# Altium footprint library connector.PcbLib: 138 footprints (part 3 of 9)
Each footprint in its own frame and in the unit in brackets; x right, y up, seen from the top. Pads: shape width x height; smd on the part's side, far side on the other; paste and mask are expansions set on the pad; w line width, h text height; cw(c..) or ccw(c..) is an arc to the next point about the centre after c.
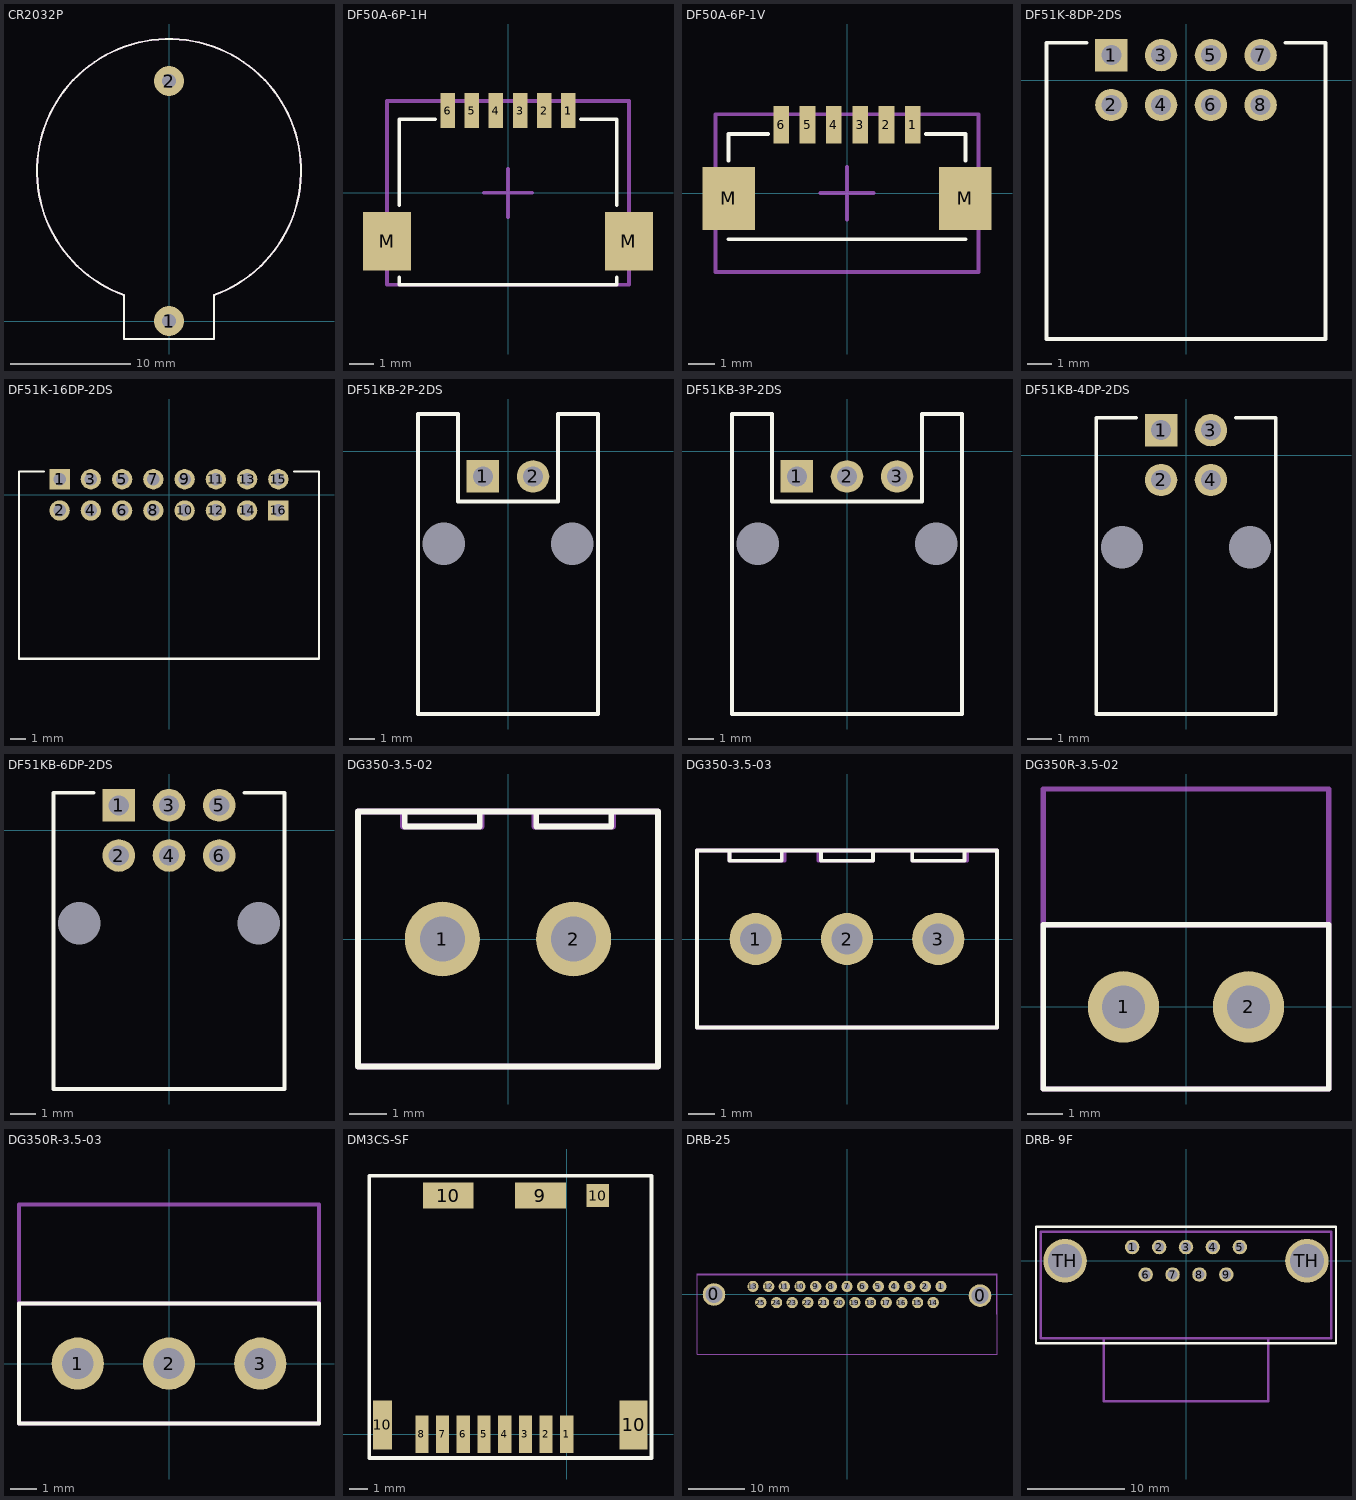
[diagram p2: the footprints below, top view; thin cyan lines are the x and y axes]

## CR2032P [mm] "Top and Side Loading Coin Cell Holders"
pads (2):
  round 2.5 hole 1.2: 1(0,0) 2(0,20)
Top Overlay:
  lines w0.15: -3.759,2.162 cw(c0,12.5) 3.759,2.162 ; -3.75,2.162 -3.75,-1.5 3.75,-1.5 3.75,2.162
Mechanical 29:
  lines w0.15: -3.759,1.162 -3.75,1.162 ; -3.759,2.162 cw(c0,12.5) 3.759,2.162 ; -3.759,2.165 -3.759,-1.5 3.741,-1.5 3.741,2.165 ; 3.75,1.162 3.759,1.162
  text ".Designator" at -3.5,11.7 h1
3D body "User Library-CR2032_HOR_HOLD.step": height 8.5, standoff -4, extent -11,-1 11,23.5

## DF50A-6P-1H [mm]
height 7.05
pads (9):
  rect 0.6x1.44 smd: 1(2.5,3.4) 1(2.5,3.4) 2(1.5,3.4) 3(0.5,3.4) 4(-0.5,3.4) 5(-1.5,3.4) 6(-2.5,3.4)
  rect 2x2.4 smd: M(-5,-2) M(5,-2)
Top Overlay:
  lines w0.15: -4.5,-3.5 -4.5,-3.8 4.5,-3.8 4.5,-3.5 ; -4.5,-0.5 -4.5,3.05 -3,3.05 ; 3,3.05 4.5,3.05 4.5,-0.5
  text "." at 3.7,3.5 h0.1
Mechanical 15:
  lines w0.15: -1,0 0,0 ; 0,-1 0,0 ; 0,1 0,0 ; 1,0 0,0 ; -5,-3.8 5,-3.8 5,3.8 -5,3.8 -5,-3.8
3D body "DF50A-6P-1H.stp": height 6.07, standoff -0.01, extent -5.405,-3.8 5.405,3.8

## DF50A-6P-1V [mm]
height 7.05
pads (9):
  rect 0.6x1.44 smd: 1(2.5,2.6) 1(2.5,2.6) 2(1.5,2.6) 3(0.5,2.6) 4(-0.5,2.6) 5(-1.5,2.6) 6(-2.5,2.6)
  rect 2x2.4 smd: M(-4.5,-0.2) M(4.5,-0.2)
Top Overlay:
  lines w0.15: -4.5,-1.75 0,-1.75 4.5,-1.75 ; -4.5,1.25 -4.5,2.25 -3,2.25 ; 3,2.25 4.5,2.25 4.5,1.25
  text "." at 3.6,2.7 h0.1
Mechanical 15:
  lines w0.15: -1,0 0,0 ; 0,-1 0,0 ; 0,1 0,0 ; 1,0 0,0 ; -5,-3 -5,3 5,3 5,-3 -5,-3
3D body "DF50A-6P-1V(51).stp": height 7.06, standoff 0.01, extent -4.625,-2.8 4.625,2.87

## DF51K-8DP-2DS [mm]
pads (8):
  rect 1.3x1.3 hole 0.8: 1(-3,1)
  round 1.3 hole 0.8: 2(-3,-1) 3(-1,1) 4(-1,-1) 5(1,1) 6(1,-1) 7(3,1) 8(3,-1)
Top Overlay:
  lines w0.15: -4,1.5 -5.6,1.5 -5.6,-10.4 5.6,-10.4 5.6,1.5 4,1.5
3D body "DF51K-8DP-2DS_4800594000_3D_stp.stp": height 8.78, standoff -2.97, extent -5.6,-10.377 5.6,1.523

## DF51K-16DP-2DS [mm]
pads (16):
  rect 1.3x1.3 hole 0.8: 1(-7,1) 16(7,-1)
  round 1.3 hole 0.8: 2(-7,-1) 3(-5,1) 4(-5,-1) 5(-3,1) 6(-3,-1) 7(-1,1) 8(-1,-1) 9(1,1) 10(1,-1) 11(3,1) 12(3,-1) 13(5,1) 14(5,-1) 15(7,1)
Top Overlay:
  lines w0.15: -8,1.5 -9.6,1.5 -9.6,-10.5 1.6,-10.5 ; -1.6,-10.5 9.6,-10.5 9.6,1.5 8,1.5
3D body "DF51K-16DP-2DS_4800598000_3D_stp.stp": height 9.03, standoff -2.72, extent -9.601,-10.535 9.599,1.365

## DF51KB-2P-2DS [mm]
pads (4):
  rect 1.3x1.3 hole 0.8: 1(-1,-1)
  round 1.3 hole 0.8: 2(1,-1)
  round 0 hole 1.7 unplated: 5(-2.57,-3.7) 6(2.57,-3.7)
Top Overlay:
  lines w0.15: -3.6,-10.5 -3.6,1.5 -2,1.5 -2,-2 2,-2 2,1.5 3.6,1.5 3.6,-10.5 -3.6,-10.5
3D body "DF51KB-2P-2DS_4800587000_3D_stp.stp": height 6.47, standoff -2.83, extent -3.599,-10.533 3.601,1.517

## DF51KB-3P-2DS [mm]
pads (5):
  rect 1.3x1.3 hole 0.8: 1(-2,-1)
  round 1.3 hole 0.8: 2(0,-1) 3(2,-1)
  round 0 hole 1.7 unplated: 5(-3.57,-3.7) 6(3.57,-3.7)
Top Overlay:
  lines w0.15: -4.6,-10.5 -4.6,1.5 -3,1.5 -3,-2 3,-2 3,1.5 4.6,1.5 4.6,-10.5 -4.6,-10.5
3D body "DF51KB-3P-2DS_4800588000_3D_stp.stp": height 6.41, standoff -2.89, extent -4.609,-10.46 4.591,1.59

## DF51KB-4DP-2DS [mm]
pads (6):
  rect 1.3x1.3 hole 0.8: 1(-1,1)
  round 1.3 hole 0.8: 2(-1,-1) 3(1,1) 4(1,-1)
  round 0 hole 1.7 unplated: 5(-2.57,-3.7) 6(2.57,-3.7)
Top Overlay:
  lines w0.15: -2,1.5 -3.6,1.5 -3.6,-10.4 3.6,-10.4 3.6,1.5 2,1.5
3D body "DF51KB-4DP-2DS_4800592000_3D_stp.stp": height 8.78, standoff -2.97, extent -3.6,-10.384 3.6,1.516

## DF51KB-6DP-2DS [mm]
pads (8):
  rect 1.3x1.3 hole 0.8: 1(-2,1)
  round 1.3 hole 0.8: 2(-2,-1) 3(0,1) 4(0,-1) 5(2,1) 6(2,-1)
  round 0 hole 1.7 unplated: 5(-3.57,-3.7) 6(3.57,-3.7)
Top Overlay:
  lines w0.15: -3,1.5 -4.6,1.5 -4.6,-10.3 4.6,-10.3 4.6,1.5 3,1.5
3D body "DF51KB-6DP-2DS_4800593000_3D_stp.stp": height 8.72, standoff -3.03, extent -4.6,-10.4 4.6,1.5

## DG350-3.5-02 [mm]
height 10
pads (2):
  round 2 hole 1.2: 1(-1.75,0) 2(1.75,0)
Top Overlay:
  lines w0.15: -2.75,3.4 -2.75,3 -0.75,3 -0.75,3.4 ; 0.75,3.4 0.75,3 2.75,3 2.75,3.4 ; -4,-3.4 4,-3.4 4,3.4 -4,3.4 -4,-3.4
Mechanical 29:
  lines w0.15: -2.8,3.4 -2.8,3 -0.7,3 -0.7,3.4 ; 0.7,3.4 0.7,3 2.8,3 2.8,3.4 ; -4,-3.4 -4,3.4 4,3.4 4,-3.4 -4,-3.4
  text ".Designator" at -3,-0.3 h1
3D body "DG350-3,5-02P.step": height 8.4, standoff -3.4, extent -4,-3.4 4,3.4

## DG350-3.5-03 [mm]
height 10
pads (3):
  round 2 hole 1.2: 1(-3.5,0) 2(0,0) 3(3.5,0)
Top Overlay:
  lines w0.15: -4.5,3.4 -4.5,3 -2.5,3 -2.5,3.4 ; -1,3.4 -1,3 1,3 1,3.4 ; 2.5,3.4 2.5,3 4.5,3 4.5,3.4 ; -5.75,-3.4 5.75,-3.4 5.75,3.4 -5.75,3.4 -5.75,-3.4
Mechanical 29:
  lines w0.15: -4.5,3.4 -4.5,3 -2.4,3 -2.4,3.4 ; -1.1,3.4 -1.1,3 1,3 1,3.4 ; 2.5,3.4 2.5,3 4.6,3 4.6,3.4 ; -5.75,-3.4 -5.75,3.4 5.75,3.4 5.75,-3.4 -5.75,-3.4
  text ".Designator" at -3.5,-0.3 h1
3D body "DG350-3,5-02P.step": height 8.4, standoff -3.4, extent -5.75,-3.4 2.25,3.4
3D body "DG350-3,5-02P.step": height 8.4, standoff -3.4, extent -2.25,-3.4 5.75,3.4

## DG350R-3.5-02 [mm]
height 7
pads (2):
  round 2 hole 1.2: 1(-1.75,0) 2(1.75,0)
Top Overlay:
  lines w0.15: -4,-2.3 4,-2.3 4,2.3 -4,2.3 -4,-2.3
Mechanical 29:
  lines w0.15: -4,2.3 4,2.3 ; -4,-2.3 4,-2.3 4,6.1 -4,6.1 -4,-2.3
  text ".Designator" at -3,-0.3 h1

## DG350R-3.5-03 [mm]
height 7
pads (3):
  round 2 hole 1.2: 1(-3.5,0) 2(0,0) 3(3.5,0)
Top Overlay:
  lines w0.15: -5.75,-2.3 -5.75,2.3 5.75,2.3 5.75,-2.3 -5.75,-2.3
Mechanical 29:
  lines w0.15: -5.75,2.3 5.75,2.3 ; -5.75,-2.3 -5.75,6.1 5.75,6.1 5.75,-2.3 -5.75,-2.3
  text ".Designator" at -3.5,-0.3 h1

## DM3CS-SF [mm] "Hirose,  10 (8 + 2) Position Card Connector Secure Digital - microSD™ Surface Mount, Right Angle Gold"
height 1.83
pads (13):
  rect 0.7x2 smd: 1(0,0) 2(-1.1,0) 3(-2.2,0) 4(-3.3,0) 5(-4.4,0) 6(-5.5,0) 7(-6.6,0) 8(-7.7,0)
  rect 2.7x1.4 smd: 9(-1.4,12.7) 10(-6.3,12.7)
  rect 1x2.6 smd: 10(-9.8,0.5)
  rect 1.2x1.2 smd: 10(1.65,12.7)
  rect 1.5x2.6 smd: 10(3.55,0.5)
Top Overlay:
  lines w0.2: -10.5,-1.25 -10.5,13.75 4.5,13.75 4.5,-1.25 -10.5,-1.25
3D body "DM3CS-SF.stp": height 1.93, standoff 0, extent -9.9,-0.727 3.9,13.373

## DRB-25 [mm]
height 12.5
pads (27):
  round 4 hole 3: 0(-23.52,0) 0(23.52,-0.2)
  round 2 hole 1: 1(16.62,1.42) 2(13.85,1.42) 3(11.08,1.42) 4(8.31,1.42) 5(5.54,1.42) 6(2.77,1.42) 7(0,1.42) 8(-2.77,1.42) 9(-5.54,1.42) 10(-8.31,1.42) 11(-11.08,1.42) 12(-13.85,1.42) 13(-16.62,1.42) 14(15.24,-1.42) 15(12.47,-1.42) 16(9.7,-1.42) 17(6.93,-1.42) 18(4.16,-1.42) 19(1.39,-1.42) 20(-1.38,-1.42) 21(-4.15,-1.42) 22(-6.92,-1.42) 23(-9.69,-1.42) 24(-12.46,-1.42) 25(-15.23,-1.42)
Mechanical 29:
  lines w0.15: -26.5,-3.5 -26.5,3.5 26.5,3.5 26.5,-3.5 ; -26.52,-10.6 -26.52,3.7 26.52,3.7 26.52,-10.6 -26.52,-10.6
  text ".Designator" at -3.5,-3.8 h1
3D body "DB-25S-1A5N-A191-A197.STEP": height 13.77, standoff -3.48, extent -26.55,-17.13 26.55,3.4

## DRB- 9F [mm]
height 12.5
pads (11):
  round 1.5 hole 1: 1(-5.56,1.42) 2(-2.78,1.42) 3(0,1.42) 4(2.78,1.42) 5(5.56,1.42) 6(-4.17,-1.42) 7(-1.39,-1.42) 8(1.39,-1.42) 9(4.17,-1.42)
  round 4.5 hole 3.5: TH(-12.5,0) TH(12.5,0)
Top Overlay:
  lines w0.254: -15.5,-8.5 -15.5,3.5 15.5,3.5 15.5,-8.5 -15.5,-8.5
Mechanical 29:
  lines w0.254: -8.5,-8 -8.5,-14.5 8.5,-14.5 8.5,-8 ; -15,-8 -15,3 15,3 15,-8 -15,-8
  text ".Designator" at -6,-6 h1.52
3D body "DB-9F.step": height 12.75, standoff -3.65, extent -15.25,-13.5 15.25,3.2